# Altium footprint library ConnectMedical.PcbLib: 76 footprints (part 4 of 5)
Each footprint in its own frame and in the unit in brackets; x right, y up, seen from the top. Pads: shape width x height; smd on the part's side, far side on the other; paste and mask are expansions set on the pad; w line width, h text height; cw(c..) or ccw(c..) is an arc to the next point about the centre after c.
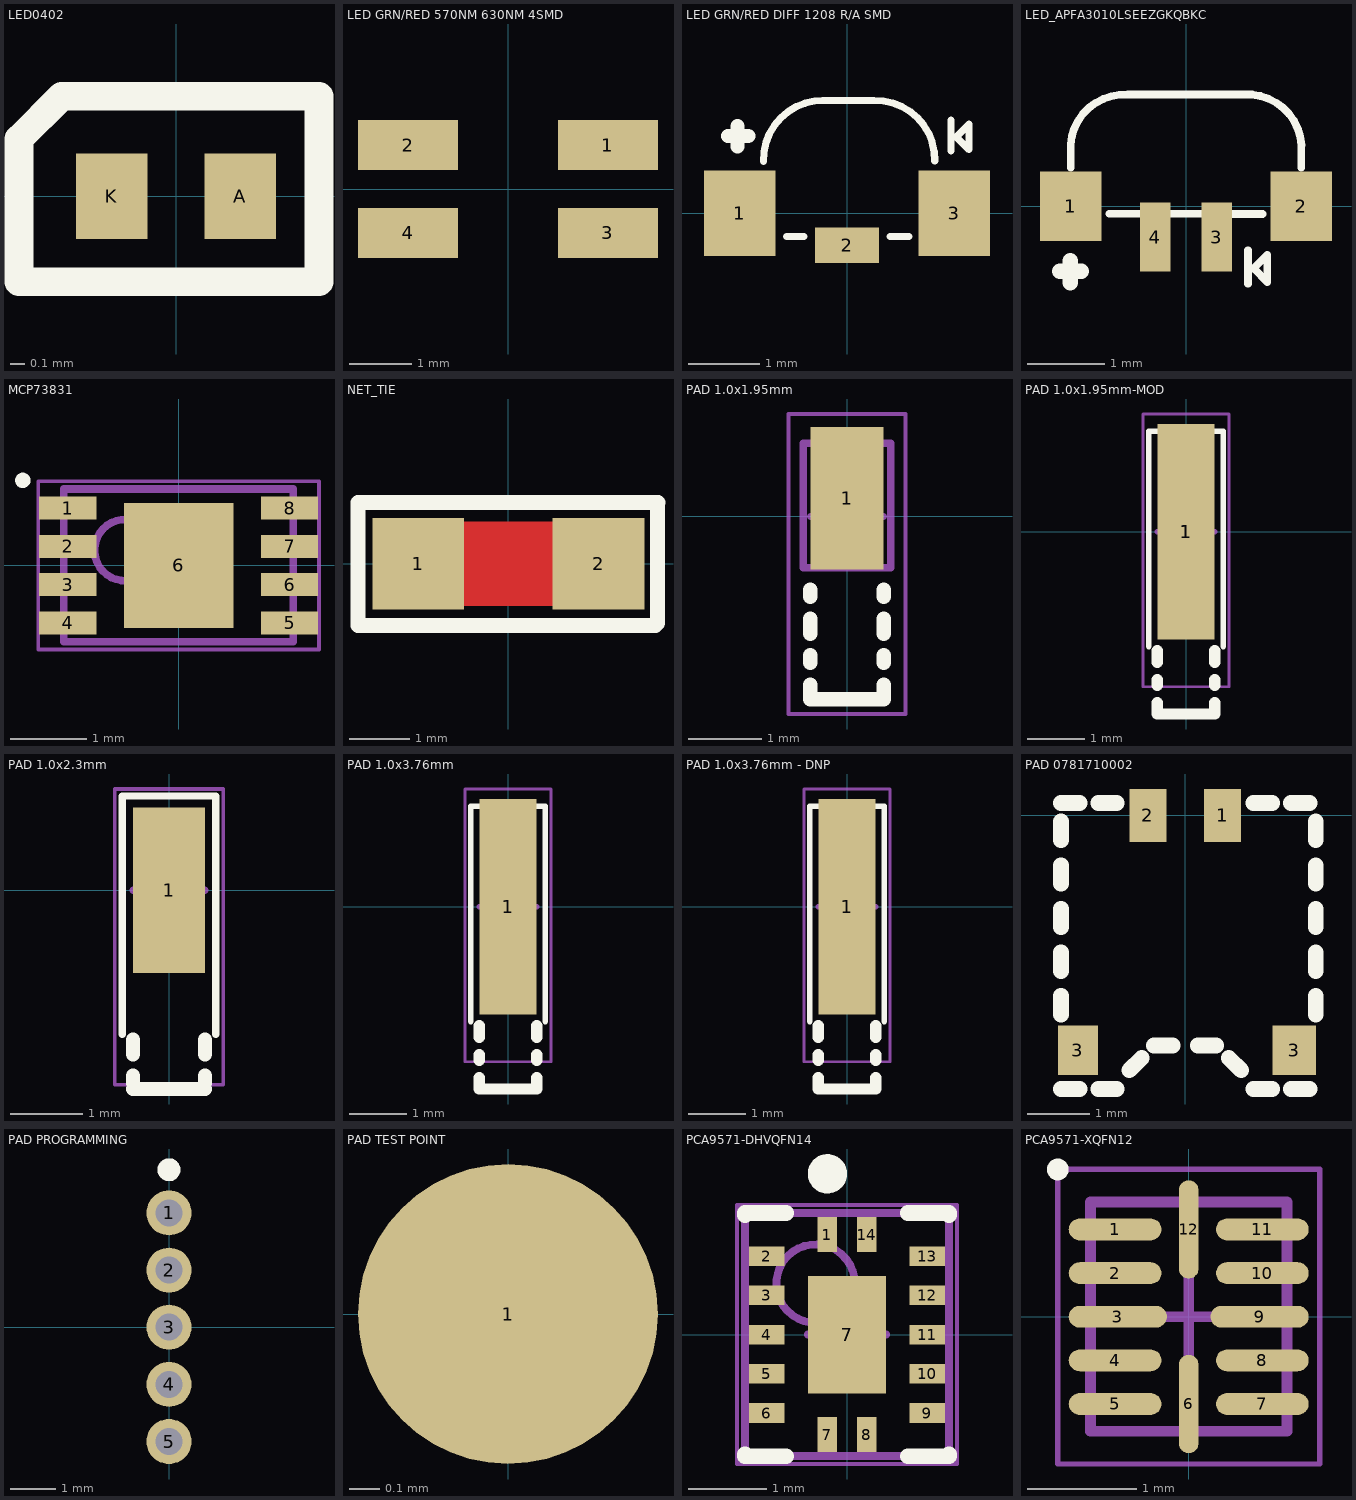
[diagram p3: the footprints below, top view; thin cyan lines are the x and y axes]

## LED0402 [mm]
pads (2):
  rect 0.5x0.6 smd: A(0.45,0) K(-0.45,0)
Top Overlay:
  lines w0.2: -1.1,-0.6 1,-0.6 1,0.7 -0.8,0.7 -1.1,0.4 -1.1,-0.6
3D body "SML-P10.STEP": height 0.2, standoff 0, extent -0.5,-0.3 0.5,0.3

## LED GRN/RED 570NM 630NM 4SMD [mm] "LED_APBD3224LSURKCGKC"
pads (4):
  rect 1.6x0.8 smd: 1(1.6,0.7) 2(-1.6,0.7) 3(1.6,-0.7) 4(-1.6,-0.7)
3D body "LED_APBD3224.STEP": height 2.15, standoff -0.26, extent -1.575,-1.225 1.625,1.175

## LED GRN/RED DIFF 1208 R/A SMD [mm] "LED_BRPY1211F-TR"
pads (3):
  rect 1x1.2 smd: 1(-1.5,0) 3(1.5,0)
  rect 0.9x0.5 smd: 2(0,-0.45)
Top Overlay:
  lines w0.1: -1.167,0.721 cw(c-0.344,0.752) -0.322,1.575 ; -0.843,-0.325 -0.6,-0.325 ; -0.344,1.575 0.375,1.575 cw(c0.405,0.752) 1.229,0.73 ; 0.6,-0.325 0.864,-0.325 ; 1.456,0.869 1.456,1.303 ; 1.529,1.067 1.707,0.888 1.707,1.245 1.529,1.067
  lines w0.2: -1.667,1.08 -1.384,1.08 ; -1.532,0.932 -1.532,1.215
3D body "BRPY1211F-TR.step": height 1.2, standoff 0, extent -1.5,-0.375 1.5,1.625
3D body: height 1.25, standoff 1.05, extent -1.198,0.125 -0.999,0.325

## LED_APFA3010LSEEZGKQBKC [mm] "LED_APFA3010LSEEZGKQBKC"
pads (4):
  rect 0.8x0.9 smd: 1(-1.5,0) 2(1.5,0)
  rect 0.4x0.9 smd: 3(0.4,-0.4) 4(-0.4,-0.4)
Top Overlay:
  lines w0.1: -1.5,0.5 -1.499,0.8 cw(c-0.802,0.753) -0.755,1.449 ; -0.997,-0.098 -0.604,-0.098 ; -0.753,1.453 0.749,1.453 cw(c0.796,0.748) 1.501,0.795 ; -0.205,-0.099 0.2,-0.099 ; 0.604,-0.101 0.994,-0.101 ; 0.806,-1.006 0.806,-0.572 ; 1.5,0.5 1.5,0.8 ; 0.879,-0.808 1.057,-0.987 1.057,-0.63 0.879,-0.808
  lines w0.2: -1.642,-0.845 -1.359,-0.845 ; -1.507,-0.993 -1.507,-0.71
3D body: height 1.1, standoff 0.9, extent -1.198,0.125 -0.999,0.325
3D body "APFA3010.STEP": height 1.01, standoff 0.01, extent -1.5,-0.047 1.5,1.456

## MCP73831 [mm] "IC CONTROLLER LI-ION 4.2V 8DFN"
height 1
pads (9):
  rect 0.75x0.3 smd: 1(-1.45,0.75) 2(-1.45,0.25) 3(-1.45,-0.25) 4(-1.45,-0.75) 5(1.45,-0.75) 6(1.45,-0.25) 7(1.45,0.25) 8(1.45,0.75)
  rect 1.43x1.63 smd: 6(0,0)
Top Overlay:
  circle w0.1: c-2.037,1.112 r0.05
Mechanical 13:
  circle w0.1: c-0.7,0.2 r0.4
  lines w0.1: -1.5,-1 1.5,-1 1.5,1 -1.5,1 -1.5,-1
Mechanical 15:
  lines w0.05: -1.835,-1.1 1.835,-1.1 1.835,1.1 -1.835,1.1 -1.835,-1.1
  lines w0.1: -0.5,0 0.5,0 ; 0,-0.5 0,0.5
3D body "MCP73831.step": height 1, standoff 0, extent -1.55,-1 1.55,1

## NET_TIE [mil]
pads (2):
  rect 60x60 smd paste-39.37 mask-43.39: 1(-59.06,0) 2(59.06,0)
Top Layer:
  rectangle: -31.5,-27.56 31.5,27.56
Top Overlay:
  lines w9.84: -98.42,-40.34 96.21,-40.34 97.54,-39.01 97.54,39.46 97.98,39.9 -98.42,39.9 -98.42,-40.34

## PAD 1.0x1.95mm [mm] "MICRO UNIVERSAL CONTACT Z 3.5MM"
height 0.6
pads (1):
  rect 1x1.95 smd: 1(0,0.25)
Top Overlay:
  lines w0.2: -0.5,-2.3 -0.5,-2.5 0.5,-2.5 0.5,-2.3 ; -0.5,-2 -0.5,-1.9 ; -0.5,-1.6 -0.5,-1.4 ; -0.5,-1.1 -0.5,-1 ; 0.5,-2 0.5,-1.9 ; 0.5,-1.6 0.5,-1.4 ; 0.5,-1.1 0.5,-1
Mechanical 13:
  lines w0.1: -0.6,-0.7 -0.6,1 0.6,1 0.6,-0.7 -0.6,-0.7
Mechanical 15:
  lines w0.05: -0.8,-2.7 -0.8,1.4 0.8,1.4 0.8,-2.7 -0.8,-2.7
  lines w0.1: -0.5,0 0.5,0 ; 0,-0.5 0,0.5
3D body "0180-004-DM-0085.step": height 3.5, standoff 0, extent -0.48,-2.59 0.48,1.2

## PAD 1.0x1.95mm-MOD [mm] "UNIVERSAL CONTACT 3.5MM SMD"
height 0.6
pads (2):
  rect 1x1.95 smd: 1(0,0)
  rect 1x3.76 smd paste-2 mask-2: 1(0,0)
Top Overlay:
  lines w0.1: -0.65,-2 -0.65,1.75 0.65,1.75 0.65,-2
  lines w0.2: -0.5,-2.975 -0.5,-3.175 0.5,-3.175 0.5,-2.975 ; -0.5,-2.675 -0.5,-2.575 ; -0.5,-2.275 -0.5,-2.075 ; 0.5,-2.675 0.5,-2.575 ; 0.5,-2.275 0.5,-2.075
Mechanical 15:
  lines w0.05: -0.75,-2.7 0.75,-2.7 0.75,2.05 -0.75,2.05 -0.75,-2.7
  lines w0.1: -0.5,0 0.5,0 ; 0,-0.5 0,0.5
3D body "120220-0314.STEP": height 3.5, standoff 0, extent -0.485,-2.695 0.475,1.095

## PAD 1.0x2.3mm [mm] "UNIVERSAL CONTACT 3MM SMD"
height 0.6
pads (1):
  rect 1x2.3 smd mask+0.08: 1(0,0)
Top Overlay:
  lines w0.1: -0.65,-2 -0.65,1.305 0.65,1.305 0.65,-2
  lines w0.2: -0.5,-2.758 0.5,-2.758 ; -0.5,-2.675 -0.5,-2.575 ; -0.5,-2.275 -0.5,-2.075 ; 0.5,-2.675 0.5,-2.575 ; 0.5,-2.275 0.5,-2.075
Mechanical 15:
  lines w0.05: -0.75,-2.7 0.75,-2.7 0.75,1.404 -0.75,1.404 -0.75,-2.7
  lines w0.1: -0.5,0 0.5,0 ; 0,-0.5 0,0.5
3D body "Micro Universal Contact Z 3.0mm.step": height 3, standoff 0, extent -0.469,-2.654 0.491,1.076

## PAD 1.0x3.76mm [mm] "UNIVERSAL CONTACT 2.5MM SMD"
height 0.6
pads (1):
  rect 1x3.76 smd mask+0.08: 1(0,0)
Top Overlay:
  lines w0.1: -0.65,-2 -0.65,1.75 0.65,1.75 0.65,-2
  lines w0.2: -0.5,-2.975 -0.5,-3.175 0.5,-3.175 0.5,-2.975 ; -0.5,-2.675 -0.5,-2.575 ; -0.5,-2.275 -0.5,-2.075 ; 0.5,-2.675 0.5,-2.575 ; 0.5,-2.275 0.5,-2.075
Mechanical 15:
  lines w0.05: -0.75,-2.7 0.75,-2.7 0.75,2.05 -0.75,2.05 -0.75,-2.7
  lines w0.1: -0.5,0 0.5,0 ; 0,-0.5 0,0.5
3D body "120220-0161.step": height 2.5, standoff 0, extent -0.49,-3.141 0.49,1.775

## PAD 1.0x3.76mm - DNP [mm] "UNIVERSAL CONTACT 2.5MM SMD"
height 0.6
pads (1):
  rect 1x3.76 smd mask+0.08: 1(0,0)
Top Overlay:
  lines w0.1: -0.65,-2 -0.65,1.75 0.65,1.75 0.65,-2
  lines w0.2: -0.5,-2.975 -0.5,-3.175 0.5,-3.175 0.5,-2.975 ; -0.5,-2.675 -0.5,-2.575 ; -0.5,-2.275 -0.5,-2.075 ; 0.5,-2.675 0.5,-2.575 ; 0.5,-2.275 0.5,-2.075
Mechanical 15:
  lines w0.05: -0.75,-2.7 -0.75,2.05 0.75,2.05 0.75,-2.7 -0.75,-2.7
  lines w0.1: -0.5,0 0.5,0 ; 0,-0.5 0,0.5

## PAD 0781710002 [mm] "PAD 1.20MM WTB HEADER VERT 2POS"
pads (4):
  rect 0.6x0.85 smd mask+0.09: 1(0.6,0) 2(-0.6,0)
  rect 0.65x0.8 smd: 3(-1.725,-3.775)
  rect 0.7x0.8 smd: 3(1.75,-3.775)
Top Overlay:
  lines w0.254: -2,-4.4 -1.7,-4.4 ; -2,-3.2 -2,-2.9 ; -2,-2.5 -2,-2.2 ; -2,-1.8 -2,-1.5 ; -2,-1.1 -2,-0.8 ; -2,-0.4 -2,-0.1 ; -2,0.2 -1.7,0.2 ; -1.4,-4.4 -1.1,-4.4 ; -1.4,0.2 -1.1,0.2 ; -0.9,-4.1 -0.7,-3.9 ; -0.5,-3.7 -0.2,-3.7 ; 0.2,-3.7 0.5,-3.7 ; 0.7,-3.9 0.9,-4.1 ; 1.1,-4.4 1.4,-4.4 ; 1.1,0.2 1.4,0.2 ; 1.7,-4.4 2,-4.4 ; 1.7,0.2 2,0.2 ; 2.1,-3.2 2.1,-2.9 ; 2.1,-2.5 2.1,-2.2 ; 2.1,-1.8 2.1,-1.5 ; 2.1,-1.1 2.1,-0.8 ; 2.1,-0.4 2.1,-0.1
3D body "781710002.stp": height 1.43, standoff -0.02, extent -2.05,-4.33 2.15,0.2

## PAD PROGRAMMING [mm] "Programming Points"
pads (5):
  round 1 hole 0.6 paste-2 mask+0: 1(0,2.54) 2(0,1.27) 3(0,0) 4(0,-1.27) 5(0,-2.54)
Top Overlay:
  circle w0.254: c0,3.5 r0.127

## PAD TEST POINT [mm] "Testing Point"
pads (1):
  round 1 smd paste-2 mask+0: 1(0,0)

## PCA9571-DHVQFN14 [mm] "PQFN, 14-Leads, Body 2.50x3.00mm, Pitch 0.50mm, Thermal Pad 1.00x1.50mm, IPC High Density"
height 1
pads (15):
  rect 0.25x0.45 smd mask+0.05: 1(-0.25,1.275) 7(-0.25,-1.275) 8(0.25,-1.275) 14(0.25,1.275)
  rect 0.45x0.25 smd mask+0.05: 2(-1.025,1) 3(-1.025,0.5) 4(-1.025,0) 5(-1.025,-0.5) 6(-1.025,-1) 9(1.025,-1) 10(1.025,-0.5) 11(1.025,0) 12(1.025,0.5) 13(1.025,1)
  rect 1x1.5 smd mask+0.05: 7(0,0)
Top Overlay:
  circle w0.25: c-0.25,2.05 r0.125
  lines w0.2: -1.3,-1.525 -1.3,-1.55 -0.775,-1.55 ; -1.3,1.525 -1.3,1.55 -0.775,1.55 ; 0.775,-1.55 1.3,-1.55 1.3,-1.525 ; 0.775,1.55 1.3,1.55 1.3,1.525
Mechanical 13:
  circle w0.1: c-0.4,0.65 r0.5
  lines w0.1: -1.3,-1.55 -1.3,1.55 1.3,1.55 1.3,-1.55 -1.3,-1.55
Mechanical 15:
  lines w0.05: -1.4,-1.65 -1.4,1.65 1.4,1.65 1.4,-1.65 -1.4,-1.65
  lines w0.1: -0.5,0 0.5,0 ; 0,-0.5 0,0.5
3D body "PCA9571-DHVQFN14.step": height 1, standoff 0, extent -1.3,-1.55 1.3,1.55

## PCA9571-XQFN12 [mm] "QFN, 12-Leads, Body 1.70x2.00mm, Pitch 0.40mm, IPC High Density"
height 0.5
pads (12):
  oval 0.85x0.2 smd mask+0.04: 1(-0.675,0.8) 2(-0.675,0.4) 4(-0.675,-0.4) 5(-0.675,-0.8) 7(0.675,-0.8) 8(0.675,-0.4) 10(0.675,0.4) 11(0.675,0.8)
  oval 0.9x0.2 smd mask+0.05: 3(-0.65,0) 9(0.65,0)
  oval 0.18x0.9 smd mask+0.05: 6(0,-0.8)
  oval 0.18x0.9 smd mask+0.04: 12(0,0.8)
Top Overlay:
  circle w0.1: c-1.2,1.35 r0.05
Mechanical 13:
  lines w0.1: -0.9,-1.05 0.9,-1.05 0.9,1.05 -0.9,1.05 -0.9,-1.05
Mechanical 15:
  lines w0.05: -1.2,-1.35 1.2,-1.35 1.2,1.35 -1.2,1.35 -1.2,-1.35
  lines w0.1: -0.5,0 0.5,0 ; 0,-0.5 0,0.5
3D body "QFN127P600-8N.step": height 0.5, standoff 0, extent -0.901,-1.051 0.901,1.051